# Altium footprint library WE-SHC.PcbLib: 139 footprints (part 6 of 10) (continued)
## 3670585 [mm] "Shielding Cabinet, SMT Frame Seamless, 58.5x49.7x4.7mm" (continued)
Notes:
  text "recommended tin paste thickness=0.5mm / customer to define the final stencil gap" at -8.75,-27.9 h0.6
Top Designator:
  text ".Designator" at -7.498,-0.5 h1.5
Top Component Outline:
  lines w0.1: -29.25,-22.85 ccw(c-27.25,-22.85) -27.25,-24.85 27.25,-24.85 ccw(c27.25,-22.85) 29.25,-22.85 29.25,22.85 ccw(c27.25,22.85) 27.25,24.85 -27.25,24.85 ccw(c-27.25,22.85) -29.25,22.85 -29.25,-22.85
Top 3D Body:
  lines w0.1: -29.25,-22.85 ccw(c-27.25,-22.85) -27.25,-24.85 27.25,-24.85 ccw(c27.25,-22.85) 29.25,-22.85 29.25,22.85 ccw(c27.25,22.85) 27.25,24.85 -27.25,24.85 ccw(c-27.25,22.85) -29.25,22.85 -29.25,-22.85
Top Courtyard:
  lines w0.05: -0.5,0 0.5,0 ; 0,-0.5 0,0.5 ; -30.05,-25.65 30.05,-25.65 30.05,25.65 -30.05,25.65 -30.05,-25.65
3D body "3670585.stp": height 4.7, standoff 0, extent -29.25,-24.85 29.25,24.85

## 3670593 [mm] "Shielding Cabinet, SMT Frame Seamless, 59.3x20.6x2.8mm"
height 2.8
pads (6):
  rect 1x15 smd paste-2539.97 mask-2222: 1(-29.5,0) 1(29.5,0)
  oval 1.5x2.4 hole 0.8 slot 1.6 at 90 deg: 1(-29.5,0) 1(29.5,0)
  rect 30x1 smd paste-2539.97 mask-2222: 1(0,-10.15) 1(0,10.15)
Top Layer:
  region: 30.25,-8.9 30.25,8.9 30.25,9.097 30.173,9.483 30.022,9.847 29.804,10.175 29.525,10.454 29.197,10.672 28.833,10.823 28.447,10.9 28.25,10.9 0.25,10.9 0.25,9.4 28.25,9.4 28.348,9.39 28.528,9.316 28.666,9.178 28.74,8.998 28.75,8.9 28.75,-8.9 28.74,-8.998 28.666,-9.178 28.528,-9.316 28.348,-9.39 28.25,-9.4 0.25,-9.4 0.25,-10.9 28.25,-10.9 28.447,-10.9 28.833,-10.823 29.197,-10.672 29.525,-10.454 29.804,-10.175 30.022,-9.847 30.173,-9.483 30.25,-9.097
  region: -30.25,-8.9 -30.25,8.9 -30.25,9.097 -30.173,9.483 -30.022,9.847 -29.804,10.175 -29.525,10.454 -29.197,10.672 -28.833,10.823 -28.447,10.9 -28.25,10.9 1,10.9 1,9.4 -28.25,9.4 -28.348,9.39 -28.528,9.316 -28.666,9.178 -28.74,8.998 -28.75,8.9 -28.75,-8.9 -28.74,-8.998 -28.666,-9.178 -28.528,-9.316 -28.348,-9.39 -28.25,-9.4 1,-9.4 1,-10.9 -28.25,-10.9 -28.447,-10.9 -28.833,-10.823 -29.197,-10.672 -29.525,-10.454 -29.804,-10.175 -30.022,-9.847 -30.173,-9.483 -30.25,-9.097
Top Paste:
  region: -30.25,-8.9 -30.25,8.9 -30.25,9.097 -30.173,9.483 -30.022,9.847 -29.804,10.175 -29.525,10.454 -29.197,10.672 -28.833,10.823 -28.447,10.9 -28.25,10.9 -0.25,10.9 -0.25,9.4 -28.25,9.4 -28.348,9.39 -28.528,9.316 -28.666,9.178 -28.74,8.998 -28.75,8.9 -28.75,-8.9 -28.74,-8.998 -28.666,-9.178 -28.528,-9.316 -28.348,-9.39 -28.25,-9.4 -0.25,-9.4 -0.25,-10.9 -28.25,-10.9 -28.447,-10.9 -28.833,-10.823 -29.197,-10.672 -29.525,-10.454 -29.804,-10.175 -30.022,-9.847 -30.173,-9.483 -30.25,-9.097
  region: 30.25,-8.9 30.25,8.9 30.25,9.097 30.173,9.483 30.022,9.847 29.804,10.175 29.525,10.454 29.197,10.672 28.833,10.823 28.447,10.9 28.25,10.9 0.25,10.9 0.25,9.4 28.25,9.4 28.348,9.39 28.528,9.316 28.666,9.178 28.74,8.998 28.75,8.9 28.75,-8.9 28.74,-8.998 28.666,-9.178 28.528,-9.316 28.348,-9.39 28.25,-9.4 0.25,-9.4 0.25,-10.9 28.25,-10.9 28.447,-10.9 28.833,-10.823 29.197,-10.672 29.525,-10.454 29.804,-10.175 30.022,-9.847 30.173,-9.483 30.25,-9.097
Notes:
  text "recommended tin paste thickness=0.5mm / customer to define the final stencil gap" at -10,-13.55 h0.6
Top Designator:
  text ".Designator" at -7.498,-0.5 h1.5
Top Component Outline:
  lines w0.1: -29.65,-8.8 ccw(c-28.15,-8.8) -28.15,-10.3 28.15,-10.3 ccw(c28.15,-8.8) 29.65,-8.8 29.65,8.8 ccw(c28.15,8.8) 28.15,10.3 -28.15,10.3 ccw(c-28.15,8.8) -29.65,8.8 -29.65,-8.8
Top 3D Body:
  lines w0.1: -29.65,-8.8 ccw(c-28.15,-8.8) -28.15,-10.3 28.15,-10.3 ccw(c28.15,-8.8) 29.65,-8.8 29.65,8.8 ccw(c28.15,8.8) 28.15,10.3 -28.15,10.3 ccw(c-28.15,8.8) -29.65,8.8 -29.65,-8.8
Top Courtyard:
  lines w0.05: -0.5,0 0.5,0 ; 0,-0.5 0,0.5 ; -30.45,-11.1 30.45,-11.1 30.45,11.1 -30.45,11.1 -30.45,-11.1
3D body "3670593.stp": height 2.8, standoff -0.6, extent -29.65,-10.3 29.65,10.3

## 3670595 [mm] "Shielding Cabinet, SMT Frame Seamless, 59.5x50.4x3.2mm"
height 3.2
pads (4):
  rect 1x30 smd paste-2539.97 mask-2222: 1(-29.6,0) 1(29.6,0)
  rect 30x1 smd paste-2539.97 mask-2222: 1(0,-25.05) 1(0,25.05)
Top Layer:
  region: -30.35,-0.25 -30.35,-22.7 -30.35,-22.903 -30.297,-23.306 -30.192,-23.699 -30.036,-24.074 -29.833,-24.426 -29.586,-24.748 -29.298,-25.036 -28.976,-25.283 -28.624,-25.486 -28.249,-25.642 -27.856,-25.747 -27.453,-25.8 -27.25,-25.8 27.25,-25.8 27.453,-25.8 27.856,-25.747 28.249,-25.642 28.624,-25.486 28.976,-25.283 29.298,-25.036 29.586,-24.748 29.833,-24.426 30.036,-24.074 30.192,-23.699 30.297,-23.306 30.35,-22.903 30.35,-22.7 30.35,-0.25 28.85,-0.25 28.85,-22.7 28.842,-22.857 28.781,-23.164 28.661,-23.454 28.487,-23.715 28.265,-23.937 28.004,-24.111 27.714,-24.231 27.407,-24.292 27.25,-24.3 -27.25,-24.3 -27.407,-24.292 -27.714,-24.231 -28.004,-24.111 -28.265,-23.937 -28.487,-23.715 -28.661,-23.454 -28.781,-23.164 -28.842,-22.857 -28.85,-22.7 -28.85,-0.25
  region: -30.35,-1 -30.35,22.7 -30.35,22.903 -30.297,23.306 -30.192,23.699 -30.036,24.074 -29.833,24.426 -29.586,24.748 -29.298,25.036 -28.976,25.283 -28.624,25.486 -28.249,25.642 -27.856,25.747 -27.453,25.8 -27.25,25.8 27.25,25.8 27.453,25.8 27.856,25.747 28.249,25.642 28.624,25.486 28.976,25.283 29.298,25.036 29.586,24.748 29.833,24.426 30.036,24.074 30.192,23.699 30.297,23.306 30.35,22.903 30.35,22.7 30.35,-1 28.85,-1 28.85,22.7 28.842,22.857 28.781,23.164 28.661,23.454 28.487,23.715 28.265,23.937 28.004,24.111 27.714,24.231 27.407,24.292 27.25,24.3 -27.25,24.3 -27.407,24.292 -27.714,24.231 -28.004,24.111 -28.265,23.937 -28.487,23.715 -28.661,23.454 -28.781,23.164 -28.842,22.857 -28.85,22.7 -28.85,-1
Top Paste:
  region: -30.35,0.25 -30.35,22.7 -30.35,22.903 -30.297,23.306 -30.192,23.699 -30.036,24.074 -29.833,24.426 -29.586,24.748 -29.298,25.036 -28.976,25.283 -28.624,25.486 -28.249,25.642 -27.856,25.747 -27.453,25.8 -27.25,25.8 27.25,25.8 27.453,25.8 27.856,25.747 28.249,25.642 28.624,25.486 28.976,25.283 29.298,25.036 29.586,24.748 29.833,24.426 30.036,24.074 30.192,23.699 30.297,23.306 30.35,22.903 30.35,22.7 30.35,0.25 28.85,0.25 28.85,22.7 28.842,22.857 28.781,23.164 28.661,23.454 28.487,23.715 28.265,23.937 28.004,24.111 27.714,24.231 27.407,24.292 27.25,24.3 -27.25,24.3 -27.407,24.292 -27.714,24.231 -28.004,24.111 -28.265,23.937 -28.487,23.715 -28.661,23.454 -28.781,23.164 -28.842,22.857 -28.85,22.7 -28.85,0.25
  region: -30.35,-0.25 -30.35,-22.7 -30.35,-22.903 -30.297,-23.306 -30.192,-23.699 -30.036,-24.074 -29.833,-24.426 -29.586,-24.748 -29.298,-25.036 -28.976,-25.283 -28.624,-25.486 -28.249,-25.642 -27.856,-25.747 -27.453,-25.8 -27.25,-25.8 27.25,-25.8 27.453,-25.8 27.856,-25.747 28.249,-25.642 28.624,-25.486 28.976,-25.283 29.298,-25.036 29.586,-24.748 29.833,-24.426 30.036,-24.074 30.192,-23.699 30.297,-23.306 30.35,-22.903 30.35,-22.7 30.35,-0.25 28.85,-0.25 28.85,-22.7 28.842,-22.857 28.781,-23.164 28.661,-23.454 28.487,-23.715 28.265,-23.937 28.004,-24.111 27.714,-24.231 27.407,-24.292 27.25,-24.3 -27.25,-24.3 -27.407,-24.292 -27.714,-24.231 -28.004,-24.111 -28.265,-23.937 -28.487,-23.715 -28.661,-23.454 -28.781,-23.164 -28.842,-22.857 -28.85,-22.7 -28.85,-0.25
Notes:
  text "recommended tin paste thickness=0.5mm / customer to define the final stencil gap" at -9.75,-28.25 h0.6
Top Designator:
  text ".Designator" at -7.498,-0.5 h1.5
Top Component Outline:
  lines w0.1: -29.75,-22.7 ccw(c-27.25,-22.7) -27.25,-25.2 27.25,-25.2 ccw(c27.25,-22.7) 29.75,-22.7 29.75,22.7 ccw(c27.25,22.7) 27.25,25.2 -27.25,25.2 ccw(c-27.25,22.7) -29.75,22.7 -29.75,-22.7
Top 3D Body:
  lines w0.1: -29.75,-22.7 ccw(c-27.25,-22.7) -27.25,-25.2 27.25,-25.2 ccw(c27.25,-22.7) 29.75,-22.7 29.75,22.7 ccw(c27.25,22.7) 27.25,25.2 -27.25,25.2 ccw(c-27.25,22.7) -29.75,22.7 -29.75,-22.7
Top Courtyard:
  lines w0.05: -0.5,0 0.5,0 ; 0,-0.5 0,0.5 ; -30.55,-26 30.55,-26 30.55,26 -30.55,26 -30.55,-26
3D body "3670595.stp": height 3.2, standoff 0, extent -29.75,-25.2 29.75,25.2

## 3670631 [mm] "Shielding Cabinet, SMT Frame Seamless, 63.1x35.5x2.8mm"
height 2.8
pads (4):
  rect 1x30 smd paste-2539.97 mask-2222: 1(-31.4,0) 1(31.4,0)
  rect 40x1 smd paste-2539.97 mask-2222: 1(0,-17.6) 1(0,17.6)
Top Layer:
  region: -32.15,-0.25 -32.15,-16.15 -32.15,-16.367 -32.065,-16.792 -31.9,-17.192 -31.659,-17.552 -31.352,-17.859 -30.992,-18.1 -30.592,-18.265 -30.167,-18.35 -29.95,-18.35 29.95,-18.35 30.167,-18.35 30.592,-18.265 30.992,-18.1 31.352,-17.859 31.659,-17.552 31.9,-17.192 32.065,-16.792 32.15,-16.367 32.15,-16.15 32.15,-0.25 30.65,-0.25 30.65,-16.15 30.647,-16.219 30.62,-16.353 30.567,-16.48 30.491,-16.594 30.394,-16.691 30.28,-16.767 30.153,-16.82 30.019,-16.847 29.95,-16.85 -29.95,-16.85 -30.019,-16.847 -30.153,-16.82 -30.28,-16.767 -30.394,-16.691 -30.491,-16.594 -30.567,-16.48 -30.62,-16.353 -30.647,-16.219 -30.65,-16.15 -30.65,-0.25
  region: -32.15,-1 -32.15,16.15 -32.15,16.367 -32.065,16.792 -31.9,17.192 -31.659,17.552 -31.352,17.859 -30.992,18.1 -30.592,18.265 -30.167,18.35 -29.95,18.35 29.95,18.35 30.167,18.35 30.592,18.265 30.992,18.1 31.352,17.859 31.659,17.552 31.9,17.192 32.065,16.792 32.15,16.367 32.15,16.15 32.15,-1 30.65,-1 30.65,16.15 30.647,16.219 30.62,16.353 30.567,16.48 30.491,16.594 30.394,16.691 30.28,16.767 30.153,16.82 30.019,16.847 29.95,16.85 -29.95,16.85 -30.019,16.847 -30.153,16.82 -30.28,16.767 -30.394,16.691 -30.491,16.594 -30.567,16.48 -30.62,16.353 -30.647,16.219 -30.65,16.15 -30.65,-1
Top Paste:
  region: -32.15,0.25 -32.15,16.15 -32.15,16.367 -32.065,16.792 -31.9,17.192 -31.659,17.552 -31.352,17.859 -30.992,18.1 -30.592,18.265 -30.167,18.35 -29.95,18.35 29.95,18.35 30.167,18.35 30.592,18.265 30.992,18.1 31.352,17.859 31.659,17.552 31.9,17.192 32.065,16.792 32.15,16.367 32.15,16.15 32.15,0.25 30.65,0.25 30.65,16.15 30.647,16.219 30.62,16.353 30.567,16.48 30.491,16.594 30.394,16.691 30.28,16.767 30.153,16.82 30.019,16.847 29.95,16.85 -29.95,16.85 -30.019,16.847 -30.153,16.82 -30.28,16.767 -30.394,16.691 -30.491,16.594 -30.567,16.48 -30.62,16.353 -30.647,16.219 -30.65,16.15 -30.65,0.25
  region: -32.15,-0.25 -32.15,-16.15 -32.15,-16.367 -32.065,-16.792 -31.9,-17.192 -31.659,-17.552 -31.352,-17.859 -30.992,-18.1 -30.592,-18.265 -30.167,-18.35 -29.95,-18.35 29.95,-18.35 30.167,-18.35 30.592,-18.265 30.992,-18.1 31.352,-17.859 31.659,-17.552 31.9,-17.192 32.065,-16.792 32.15,-16.367 32.15,-16.15 32.15,-0.25 30.65,-0.25 30.65,-16.15 30.647,-16.219 30.62,-16.353 30.567,-16.48 30.491,-16.594 30.394,-16.691 30.28,-16.767 30.153,-16.82 30.019,-16.847 29.95,-16.85 -29.95,-16.85 -30.019,-16.847 -30.153,-16.82 -30.28,-16.767 -30.394,-16.691 -30.491,-16.594 -30.567,-16.48 -30.62,-16.353 -30.647,-16.219 -30.65,-16.15 -30.65,-0.25
Notes:
  text "recommended tin paste thickness=0.5mm / customer to define the final stencil gap" at -9.1,-20.95 h0.6
Top Designator:
  text ".Designator" at -7.498,-0.5 h1.5
Top Component Outline:
  lines w0.1: -31.55,-16.25 ccw(c-30.05,-16.25) -30.05,-17.75 30.05,-17.75 ccw(c30.05,-16.25) 31.55,-16.25 31.55,16.25 ccw(c30.05,16.25) 30.05,17.75 -30.05,17.75 ccw(c-30.05,16.25) -31.55,16.25 -31.55,-16.25
Top 3D Body:
  lines w0.1: -31.55,-16.25 ccw(c-30.05,-16.25) -30.05,-17.75 30.05,-17.75 ccw(c30.05,-16.25) 31.55,-16.25 31.55,16.25 ccw(c30.05,16.25) 30.05,17.75 -30.05,17.75 ccw(c-30.05,16.25) -31.55,16.25 -31.55,-16.25
Top Courtyard:
  lines w0.05: -0.5,0 0.5,0 ; 0,-0.5 0,0.5 ; -32.35,-18.55 -32.35,18.55 32.35,18.55 32.35,-18.55 -32.35,-18.55
3D body "3670631.stp": height 2.8, standoff 0, extent -31.55,-17.75 31.55,17.75

## 3670638 [mm] "Shielding Cabinet, SMT Frame Seamless, 63.8x36.3x11mm"
height 11
pads (4):
  rect 1x30 smd paste-2539.97 mask-2222: 1(-31.75,0) 1(31.75,0)
  rect 40x1 smd paste-2539.97 mask-2222: 1(0,-18) 1(0,18)
Top Layer:
  region: -32.5,-0.25 -32.5,-14.65 -32.5,-14.919 -32.43,-15.452 -32.291,-15.971 -32.085,-16.467 -31.816,-16.933 -31.489,-17.359 -31.109,-17.739 -30.683,-18.066 -30.217,-18.335 -29.721,-18.541 -29.202,-18.68 -28.669,-18.75 -28.4,-18.75 28.4,-18.75 28.669,-18.75 29.202,-18.68 29.721,-18.541 30.217,-18.335 30.683,-18.066 31.109,-17.739 31.489,-17.359 31.816,-16.933 32.085,-16.467 32.291,-15.971 32.43,-15.452 32.5,-14.919 32.5,-14.65 32.5,-0.25 31,-0.25 31,-14.65 30.987,-14.905 30.888,-15.405 30.693,-15.876 30.41,-16.299 30.049,-16.66 29.626,-16.943 29.155,-17.138 28.655,-17.237 28.4,-17.25 -28.4,-17.25 -28.655,-17.237 -29.155,-17.138 -29.626,-16.943 -30.049,-16.66 -30.41,-16.299 -30.693,-15.876 -30.888,-15.405 -30.987,-14.905 -31,-14.65 -31,-0.25
  region: -32.5,-1 -32.5,14.65 -32.5,14.919 -32.43,15.452 -32.291,15.971 -32.085,16.467 -31.816,16.933 -31.489,17.359 -31.109,17.739 -30.683,18.066 -30.217,18.335 -29.721,18.541 -29.202,18.68 -28.669,18.75 -28.4,18.75 28.4,18.75 28.669,18.75 29.202,18.68 29.721,18.541 30.217,18.335 30.683,18.066 31.109,17.739 31.489,17.359 31.816,16.933 32.085,16.467 32.291,15.971 32.43,15.452 32.5,14.919 32.5,14.65 32.5,-1 31,-1 31,14.65 30.987,14.905 30.888,15.405 30.693,15.876 30.41,16.299 30.049,16.66 29.626,16.943 29.155,17.138 28.655,17.237 28.4,17.25 -28.4,17.25 -28.655,17.237 -29.155,17.138 -29.626,16.943 -30.049,16.66 -30.41,16.299 -30.693,15.876 -30.888,15.405 -30.987,14.905 -31,14.65 -31,-1
Top Paste:
  region: -32.5,0.25 -32.5,14.65 -32.5,14.919 -32.43,15.452 -32.291,15.971 -32.085,16.467 -31.816,16.933 -31.489,17.359 -31.109,17.739 -30.683,18.066 -30.217,18.335 -29.721,18.541 -29.202,18.68 -28.669,18.75 -28.4,18.75 28.4,18.75 28.669,18.75 29.202,18.68 29.721,18.541 30.217,18.335 30.683,18.066 31.109,17.739 31.489,17.359 31.816,16.933 32.085,16.467 32.291,15.971 32.43,15.452 32.5,14.919 32.5,14.65 32.5,0.25 31,0.25 31,14.65 30.987,14.905 30.888,15.405 30.693,15.876 30.41,16.299 30.049,16.66 29.626,16.943 29.155,17.138 28.655,17.237 28.4,17.25 -28.4,17.25 -28.655,17.237 -29.155,17.138 -29.626,16.943 -30.049,16.66 -30.41,16.299 -30.693,15.876 -30.888,15.405 -30.987,14.905 -31,14.65 -31,0.25
  region: -32.5,-0.25 -32.5,-14.65 -32.5,-14.919 -32.43,-15.452 -32.291,-15.971 -32.085,-16.467 -31.816,-16.933 -31.489,-17.359 -31.109,-17.739 -30.683,-18.066 -30.217,-18.335 -29.721,-18.541 -29.202,-18.68 -28.669,-18.75 -28.4,-18.75 28.4,-18.75 28.669,-18.75 29.202,-18.68 29.721,-18.541 30.217,-18.335 30.683,-18.066 31.109,-17.739 31.489,-17.359 31.816,-16.933 32.085,-16.467 32.291,-15.971 32.43,-15.452 32.5,-14.919 32.5,-14.65 32.5,-0.25 31,-0.25 31,-14.65 30.987,-14.905 30.888,-15.405 30.693,-15.876 30.41,-16.299 30.049,-16.66 29.626,-16.943 29.155,-17.138 28.655,-17.237 28.4,-17.25 -28.4,-17.25 -28.655,-17.237 -29.155,-17.138 -29.626,-16.943 -30.049,-16.66 -30.41,-16.299 -30.693,-15.876 -30.888,-15.405 -30.987,-14.905 -31,-14.65 -31,-0.25
Notes:
  text "recommended tin paste thickness=0.5mm / customer to define the final stencil gap" at -9.1,-20.95 h0.6
Top Designator:
  text ".Designator" at -7.498,-0.5 h1.5
Top Component Outline:
  lines w0.1: -31.9,-14.65 ccw(c-28.4,-14.65) -28.4,-18.15 28.4,-18.15 ccw(c28.4,-14.65) 31.9,-14.65 31.9,14.65 ccw(c28.4,14.65) 28.4,18.15 -28.4,18.15 ccw(c-28.4,14.65) -31.9,14.65 -31.9,-14.65
Top 3D Body:
  lines w0.1: -31.9,-14.65 ccw(c-28.4,-14.65) -28.4,-18.15 28.4,-18.15 ccw(c28.4,-14.65) 31.9,-14.65 31.9,14.65 ccw(c28.4,14.65) 28.4,18.15 -28.4,18.15 ccw(c-28.4,14.65) -31.9,14.65 -31.9,-14.65
Top Courtyard:
  lines w0.05: -0.5,0 0.5,0 ; 0,-0.5 0,0.5 ; -32.7,-18.95 32.7,-18.95 32.7,18.95 -32.7,18.95 -32.7,-18.95
3D body "3670638.stp": height 11, standoff 0, extent -31.9,-18.15 31.9,18.15

## 3670737 [mm] "Shielding Cabinet, SMT Frame Seamless, 73.7x28.1x2.9mm"
height 2.9
pads (6):
  rect 1x20 smd paste-2539.97 mask-2222: 1(-36.7,0) 1(36.7,0)
  oval 2.5x1.5 hole 0.8 slot 1.8 at 0 deg: 1(-33.65,13.9) 1(33.65,-13.9)
  rect 40x1 smd paste-2539.97 mask-2222: 1(0,-13.9) 1(0,13.9)
Top Layer:
  region: -37.45,-0.25 -37.45,-11.75 -37.45,-11.94 -37.4,-12.317 -37.302,-12.684 -37.157,-13.035 -36.966,-13.365 -36.735,-13.666 -36.466,-13.935 -36.165,-14.166 -35.835,-14.357 -35.484,-14.502 -35.117,-14.6 -34.74,-14.65 -34.55,-14.65 34.55,-14.65 34.74,-14.65 35.117,-14.6 35.484,-14.502 35.835,-14.357 36.165,-14.166 36.466,-13.935 36.735,-13.666 36.966,-13.365 37.157,-13.035 37.302,-12.684 37.4,-12.317 37.45,-11.94 37.45,-11.75 37.45,-0.25 35.95,-0.25 35.95,-11.75 35.943,-11.887 35.89,-12.156 35.785,-12.41 35.632,-12.638 35.438,-12.832 35.21,-12.985 34.956,-13.09 34.687,-13.143 34.55,-13.15 -34.55,-13.15 -34.687,-13.143 -34.956,-13.09 -35.21,-12.985 -35.438,-12.832 -35.632,-12.638 -35.785,-12.41 -35.89,-12.156 -35.943,-11.887 -35.95,-11.75 -35.95,-0.25
  region: -37.45,-1 -37.45,11.75 -37.45,11.94 -37.4,12.317 -37.302,12.684 -37.157,13.035 -36.966,13.365 -36.735,13.666 -36.466,13.935 -36.165,14.166 -35.835,14.357 -35.484,14.502 -35.117,14.6 -34.74,14.65 -34.55,14.65 34.55,14.65 34.74,14.65 35.117,14.6 35.484,14.502 35.835,14.357 36.165,14.166 36.466,13.935 36.735,13.666 36.966,13.365 37.157,13.035 37.302,12.684 37.4,12.317 37.45,11.94 37.45,11.75 37.45,-1 35.95,-1 35.95,11.75 35.943,11.887 35.89,12.156 35.785,12.41 35.632,12.638 35.438,12.832 35.21,12.985 34.956,13.09 34.687,13.143 34.55,13.15 -34.55,13.15 -34.687,13.143 -34.956,13.09 -35.21,12.985 -35.438,12.832 -35.632,12.638 -35.785,12.41 -35.89,12.156 -35.943,11.887 -35.95,11.75 -35.95,-1
Top Paste:
  region: -37.45,0.25 -37.45,11.75 -37.45,11.94 -37.4,12.317 -37.302,12.684 -37.157,13.035 -36.966,13.365 -36.735,13.666 -36.466,13.935 -36.165,14.166 -35.835,14.357 -35.484,14.502 -35.117,14.6 -34.74,14.65 -34.55,14.65 34.55,14.65 34.74,14.65 35.117,14.6 35.484,14.502 35.835,14.357 36.165,14.166 36.466,13.935 36.735,13.666 36.966,13.365 37.157,13.035 37.302,12.684 37.4,12.317 37.45,11.94 37.45,11.75 37.45,0.25 35.95,0.25 35.95,11.75 35.943,11.887 35.89,12.156 35.785,12.41 35.632,12.638 35.438,12.832 35.21,12.985 34.956,13.09 34.687,13.143 34.55,13.15 -34.55,13.15 -34.687,13.143 -34.956,13.09 -35.21,12.985 -35.438,12.832 -35.632,12.638 -35.785,12.41 -35.89,12.156 -35.943,11.887 -35.95,11.75 -35.95,0.25
  region: -37.45,-0.25 -37.45,-11.75 -37.45,-11.94 -37.4,-12.317 -37.302,-12.684 -37.157,-13.035 -36.966,-13.365 -36.735,-13.666 -36.466,-13.935 -36.165,-14.166 -35.835,-14.357 -35.484,-14.502 -35.117,-14.6 -34.74,-14.65 -34.55,-14.65 34.55,-14.65 34.74,-14.65 35.117,-14.6 35.484,-14.502 35.835,-14.357 36.165,-14.166 36.466,-13.935 36.735,-13.666 36.966,-13.365 37.157,-13.035 37.302,-12.684 37.4,-12.317 37.45,-11.94 37.45,-11.75 37.45,-0.25 35.95,-0.25 35.95,-11.75 35.943,-11.887 35.89,-12.156 35.785,-12.41 35.632,-12.638 35.438,-12.832 35.21,-12.985 34.956,-13.09 34.687,-13.143 34.55,-13.15 -34.55,-13.15 -34.687,-13.143 -34.956,-13.09 -35.21,-12.985 -35.438,-12.832 -35.632,-12.638 -35.785,-12.41 -35.89,-12.156 -35.943,-11.887 -35.95,-11.75 -35.95,-0.25
Notes:
  text "recommended tin paste thickness=0.5mm / customer to define the final stencil gap" at -9.45,-17.4 h0.6
Top Designator:
  text ".Designator" at -7.498,-0.5 h1.5
Top Component Outline:
  lines w0.1: -36.85,-11.8 ccw(c-34.6,-11.8) -34.6,-14.05 34.6,-14.05 ccw(c34.6,-11.8) 36.85,-11.8 36.85,11.8 ccw(c34.6,11.8) 34.6,14.05 -34.6,14.05 ccw(c-34.6,11.8) -36.85,11.8 -36.85,-11.8
Top 3D Body:
  lines w0.1: -36.85,-11.8 ccw(c-34.6,-11.8) -34.6,-14.05 34.6,-14.05 ccw(c34.6,-11.8) 36.85,-11.8 36.85,11.8 ccw(c34.6,11.8) 34.6,14.05 -34.6,14.05 ccw(c-34.6,11.8) -36.85,11.8 -36.85,-11.8
Top Courtyard:
  lines w0.05: -0.5,0 0.5,0 ; 0,-0.5 0,0.5 ; -37.65,-14.85 -37.65,14.85 37.65,14.85 37.65,-14.85 -37.65,-14.85
3D body "3670737.stp": height 2.9, standoff -1, extent -36.85,-14.05 36.85,14.05

## 36103166S [mm] "Shielding Cabinet, SMD Frame, body 16.5x16.5mm"
height 3.65
pads (12):
  rect 1x4.35 smd: 1(-8.15,-6.475) 1(-8.15,6.475) 1(8.15,-6.475) 1(8.15,6.475)
  rect 1x3.3 smd: 1(-8.15,0) 1(8.15,0)
  rect 4.35x1 smd: 1(-6.475,-8.15) 1(-6.475,8.15) 1(6.475,-8.15) 1(6.475,8.15)
  rect 3.3x1 smd: 1(0,-8.15) 1(0,8.15)
Top Overlay:
  lines w0.2: -8.3,-4 -8.3,-1.95 ; -8.3,1.95 -8.3,4 ; -4,-8.3 -1.95,-8.3 ; -4,8.3 -1.95,8.3 ; 1.95,-8.3 4,-8.3 ; 1.95,8.3 4,8.3 ; 8.3,-4 8.3,-1.95 ; 8.3,1.95 8.3,4
Top Designator:
  text ".Designator" at -7.498,-0.5 h1.5
Top Component Outline:
  lines w0.1: -8.25,-8.25 8.25,-8.25 8.25,8.25 -8.25,8.25 -8.25,-8.25
Top 3D Body:
  lines w0.1: -8.25,-8.25 -8.25,8.25 8.25,8.25 8.25,-8.25 -8.25,-8.25
Top Courtyard:
  lines w0.05: -0.5,0 0.5,0 ; 0,-0.5 0,0.5 ; -8.85,-8.85 8.85,-8.85 8.85,8.85 -8.85,8.85 -8.85,-8.85
3D body "36103166S.stp": height 3.6, standoff 0, extent -8.25,-8.25 8.25,8.25

## 36103205 [mm] "Shielding Cabinet, SMD Frame, body 21x21mm"
height 3.6
pads (16):
  rect 1x3.3 smd: 1(-10.25,-9.1) 1(-10.25,9.1) 1(10.25,-9.1) 1(10.25,9.1)
  rect 1x2.6 smd: 1(-10.25,-3.75) 1(-10.25,3.75) 1(10.25,-3.75) 1(10.25,3.75)
  rect 3.3x1 smd: 1(-9.1,-10.25) 1(-9.1,10.25) 1(9.1,-10.25) 1(9.1,10.25)
  rect 2.6x1 smd: 1(-3.75,-10.25) 1(-3.75,10.25) 1(3.75,-10.25) 1(3.75,10.25)
Top Overlay:
  lines w0.2: -10.55,-7.15 -10.55,-5.35 ; -10.55,-2.15 -10.55,2.15 ; -10.55,5.35 -10.55,7.15 ; -7.15,-10.55 -5.35,-10.55 ; -7.15,10.55 -5.35,10.55 ; -2.15,-10.55 2.15,-10.55 ; -2.15,10.55 2.15,10.55 ; 5.35,-10.55 7.15,-10.55 ; 5.35,10.55 7.15,10.55 ; 10.55,-7.15 10.55,-5.35 ; 10.55,-2.15 10.55,2.15 ; 10.55,5.35 10.55,7.15
Top Designator:
  text ".Designator" at -7.498,-0.5 h1.5
Top Component Outline:
  lines w0.1: -10.5,-10.5 10.5,-10.5 10.5,10.5 -10.5,10.5 -10.5,-10.5
Top 3D Body:
  lines w0.1: -10.5,-10.5 -10.5,10.5 10.5,10.5 10.5,-10.5 -10.5,-10.5
Top Courtyard:
  lines w0.05: -0.5,0 0.5,0 ; 0,-0.5 0,0.5 ; -10.95,-10.95 10.95,-10.95 10.95,10.95 -10.95,10.95 -10.95,-10.95
3D body "36103205 (rev1).stp": height 3.5, standoff 0, extent -10.5,-10.5 10.5,10.5

## 36103205S [mm] "Shielding Cabinet, SMD Frame, body 20.4x20.4mm"
height 3.3
pads (16):
  rect 1x3.3 smd: 1(-10.25,-9.1) 1(-10.25,9.1) 1(10.25,-9.1) 1(10.25,9.1)
  rect 1x2.6 smd: 1(-10.25,-3.75) 1(-10.25,3.75) 1(10.25,-3.75) 1(10.25,3.75)
  rect 3.3x1 smd: 1(-9.1,-10.25) 1(-9.1,10.25) 1(9.1,-10.25) 1(9.1,10.25)
  rect 2.6x1 smd: 1(-3.75,-10.25) 1(-3.75,10.25) 1(3.75,-10.25) 1(3.75,10.25)
Top Overlay:
  lines w0.2: -10.25,-7.15 -10.25,-5.35 ; -10.25,-2.15 -10.25,2.15 ; -10.25,5.35 -10.25,7.15 ; -7.15,-10.25 -5.35,-10.25 ; -7.15,10.25 -5.35,10.25 ; -2.15,-10.25 2.15,-10.25 ; -2.15,10.25 2.15,10.25 ; 5.35,-10.25 7.15,-10.25 ; 5.35,10.25 7.15,10.25 ; 10.25,-7.15 10.25,-5.35 ; 10.25,-2.15 10.25,2.15 ; 10.25,5.35 10.25,7.15
Top Designator:
  text ".Designator" at -7.498,-0.5 h1.5
Top Component Outline:
  lines w0.1: -10.2,-10.2 10.2,-10.2 10.2,10.2 -10.2,10.2 -10.2,-10.2
Top 3D Body:
  lines w0.1: -10.2,-10.2 -10.2,10.2 10.2,10.2 10.2,-10.2 -10.2,-10.2
Top Courtyard:
  lines w0.05: -0.5,0 0.5,0 ; 0,-0.5 0,0.5 ; -10.95,-10.95 10.95,-10.95 10.95,10.95 -10.95,10.95 -10.95,-10.95
3D body "36103205S.stp": height 3.2, standoff 0, extent -10.2,-10.2 10.2,10.2

## 36103255 [mm] "Shielding Cabinet, SMD Frame, body 26x26mm"
height 3.6
pads (20):
  rect 1x3.3 smd: 1(-12.75,-11.6) 1(-12.75,11.6) 1(12.75,-11.6) 1(12.75,11.6)
  rect 1x2.6 smd: 1(-12.75,-6.25) 1(-12.75,6.25) 1(12.75,-6.25) 1(12.75,6.25)
  rect 1x5.1 smd: 1(-12.75,0) 1(12.75,0)
  rect 3.3x1 smd: 1(-11.6,-12.75) 1(-11.6,12.75) 1(11.6,-12.75) 1(11.6,12.75)
  rect 2.6x1 smd: 1(-6.25,-12.75) 1(-6.25,12.75) 1(6.25,-12.75) 1(6.25,12.75)
  rect 5.1x1 smd: 1(0,-12.75) 1(0,12.75)
Top Overlay:
  lines w0.2: -13.05,-9.65 -13.05,-7.85 ; -13.05,-4.65 -13.05,-2.85 ; -13.05,2.85 -13.05,4.65 ; -13.05,7.85 -13.05,9.65 ; -9.65,-13.05 -7.85,-13.05 ; -9.65,13.05 -7.85,13.05 ; -4.65,-13.05 -2.85,-13.05 ; -4.65,13.05 -2.85,13.05 ; 2.85,-13.05 4.65,-13.05 ; 2.85,13.05 4.65,13.05 ; 7.85,-13.05 9.65,-13.05 ; 7.85,13.05 9.65,13.05 ; 13.05,-9.65 13.05,-7.85 ; 13.05,-4.65 13.05,-2.85 ; 13.05,2.85 13.05,4.65 ; 13.05,7.85 13.05,9.65
Top Designator:
  text ".Designator" at -7.498,-0.5 h1.5
Top Component Outline:
  lines w0.1: -13,-13 -13,13 13,13 13,-13 -13,-13
Top 3D Body:
  lines w0.1: -13,-13 13,-13 13,13 -13,13 -13,-13
Top Courtyard:
  lines w0.05: -0.5,0 0.5,0 ; 0,-0.5 0,0.5 ; -13.45,-13.45 -13.45,13.45 13.45,13.45 13.45,-13.45 -13.45,-13.45
3D body "36103255.stp": height 3.5, standoff 0, extent -13,-13 13,13

## 36103255S [mm] "Shielding Cabinet, SMD Frame, 25.4x25.4mm"
height 3.3
pads (20):
  rect 1x3.3 smd: 1(-12.75,-11.6) 1(-12.75,11.6) 1(12.75,-11.6) 1(12.75,11.6)
  rect 1x2.6 smd: 1(-12.75,-6.25) 1(-12.75,6.25) 1(12.75,-6.25) 1(12.75,6.25)
  rect 1x5.1 smd: 1(-12.75,0) 1(12.75,0)
  rect 3.3x1 smd: 1(-11.6,-12.75) 1(-11.6,12.75) 1(11.6,-12.75) 1(11.6,12.75)
  rect 2.6x1 smd: 1(-6.25,-12.75) 1(-6.25,12.75) 1(6.25,-12.75) 1(6.25,12.75)
  rect 5.1x1 smd: 1(0,-12.75) 1(0,12.75)
Top Overlay:
  lines w0.2: -12.75,-9.65 -12.75,-7.85 ; -12.75,-4.65 -12.75,-2.85 ; -12.75,2.85 -12.75,4.65 ; -12.75,7.85 -12.75,9.65 ; -9.65,-12.75 -7.85,-12.75 ; -9.65,12.75 -7.85,12.75 ; -4.65,-12.75 -2.85,-12.75 ; -4.65,12.75 -2.85,12.75 ; 2.85,-12.75 4.65,-12.75 ; 2.85,12.75 4.65,12.75 ; 7.85,-12.75 9.65,-12.75 ; 7.85,12.75 9.65,12.75 ; 12.75,-9.65 12.75,-7.85 ; 12.75,-4.65 12.75,-2.85 ; 12.75,2.85 12.75,4.65 ; 12.75,7.85 12.75,9.65
Top Designator:
  text ".Designator" at -7.498,-0.5 h1.5
Top Component Outline:
  lines w0.1: -12.7,-12.7 -12.7,12.7 12.7,12.7 12.7,-12.7 -12.7,-12.7
Top 3D Body:
  lines w0.1: -12.7,-12.7 12.7,-12.7 12.7,12.7 -12.7,12.7 -12.7,-12.7
Top Courtyard:
  lines w0.05: -0.5,0 0.5,0 ; 0,-0.5 0,0.5 ; -13.45,-13.45 -13.45,13.45 13.45,13.45 13.45,-13.45 -13.45,-13.45
3D body "36103255S.stp": height 3.2, standoff 0, extent -12.7,-12.7 12.7,12.7